# Altium footprint library Indruino.PcbLib: 383 footprints (part 2 of 24)
Each footprint in its own frame and in the unit in brackets; x right, y up, seen from the top. Pads: shape width x height; smd on the part's side, far side on the other; paste and mask are expansions set on the pad; w line width, h text height; cw(c..) or ccw(c..) is an arc to the next point about the centre after c.
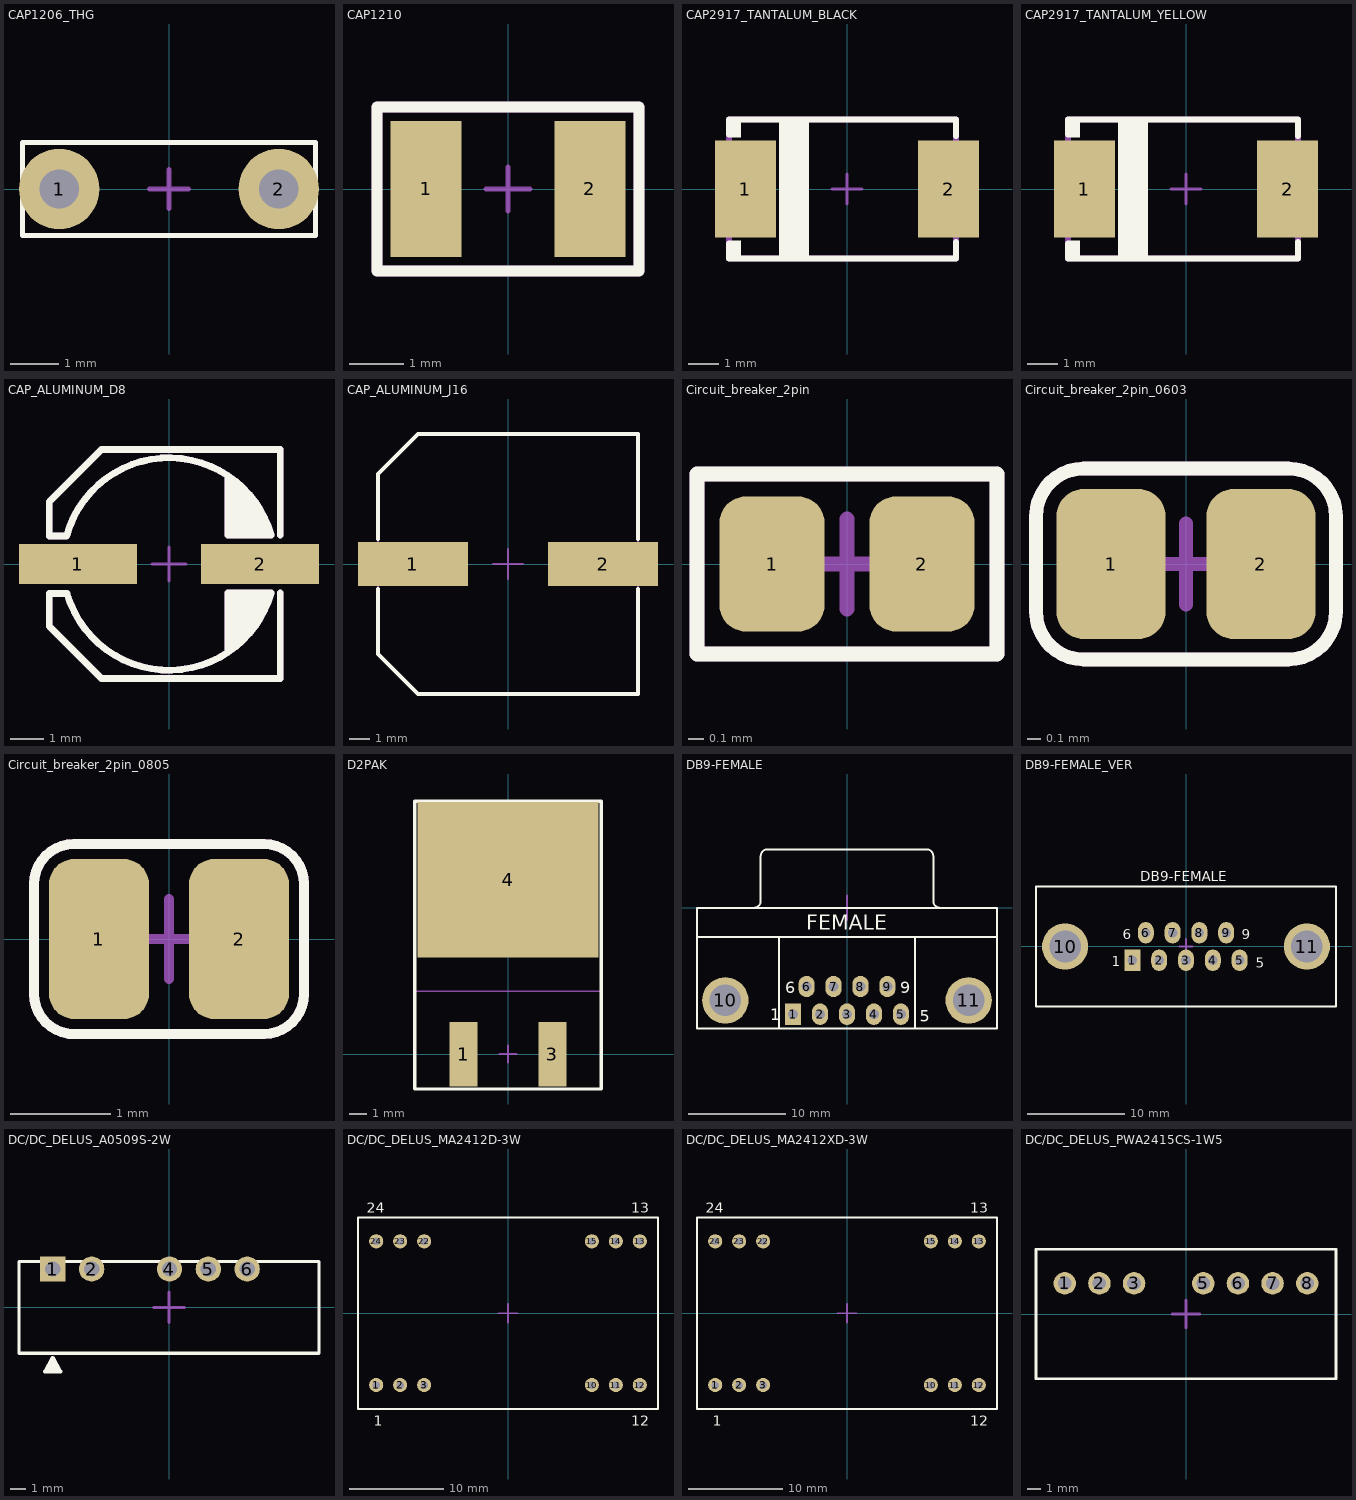
[diagram p1: the footprints below, top view; thin cyan lines are the x and y axes]

## CAP1206_THG [mm]
pads (2):
  round 1.65 hole 0.8: 1(-2.25,0) 2(2.25,0)
Top Overlay:
  lines w0.1: -3,-0.95 -3,0.95 3,0.95 3,-0.95 -3,-0.95
Mechanical 13:
  lines w0.1: -3,-0.95 -3,0.95 3,0.95 3,-0.95 -3,-0.95
Mechanical 15:
  lines w0.1: -0.4,0 0.4,0 ; 0,-0.4 0,0.4
3D body "User Library-Disc_CAP d6x3_5_5mm.step": height 8.1, standoff -2.02, extent -3,-1.05 3,1.05

## CAP1210 [mm]
pads (2):
  rect 1.3x2.5 smd: 1(-1.5,0) 2(1.5,0)
Top Overlay:
  lines w0.2: -2.4,-1.5 2.4,-1.5 2.4,1.5 -2.4,1.5 -2.4,-1.5
Mechanical 13:
  lines w0.2: -2.4,-1.5 2.4,-1.5 2.4,1.5 -2.4,1.5 -2.4,-1.5
  text "'.Designator'" at -1.95,-0.333 h0.8
Mechanical 15:
  lines w0.1: -0.4,0 0.4,0 ; 0,-0.4 0,0.4
3D body "SW3dPS-CAPC3225.STEP": height 2.5, standoff 0, extent -1.6,-1.25 1.6,1.25

## CAP2917_TANTALUM_BLACK [mm]
pads (2):
  rect 2x3.2 smd: 1(-3.35,0) 2(3.35,0)
Top Overlay:
  rectangle: -3.9,1.7 -3.5,2.4
  rectangle: -3.9,-2.4 -3.5,-1.7
  rectangle: -2.25,-2.305 -1.25,2.31
  lines w0.2: -3.9,-1.8 -3.9,-2.3 3.6,-2.3 3.6,-1.75 ; -3.9,1.8 -3.9,2.3 3.6,2.3 3.6,1.75
Mechanical 13:
  lines w0.2: -3.9,-2.3 -3.9,2.3 3.6,2.3 3.6,-2.3 -3.9,-2.3
  text "'.Designator'" at -3.2,-0.5 h1.2
Mechanical 15:
  lines w0.1: -0.5,0 0.5,0 ; 0,-0.5 0,0.5
3D body "User Library-Case Code KEMET V.STEP": height 2.1, standoff 0.1, extent -3.81,-2.3 3.79,2.3

## CAP2917_TANTALUM_YELLOW [mm]
pads (2):
  rect 2x3.2 smd: 1(-3.35,0) 2(3.35,0)
Top Overlay:
  rectangle: -2.25,-2.305 -1.25,2.31
  rectangle: -3.9,-2.4 -3.5,-1.7
  rectangle: -3.9,1.7 -3.5,2.4
  lines w0.2: -3.9,-1.8 -3.9,-2.3 3.7,-2.3 3.7,-1.75 ; -3.9,1.8 -3.9,2.3 3.7,2.3 3.7,1.75
Mechanical 13:
  lines w0.2: -3.9,-2.3 -3.9,2.3 3.7,2.3 3.7,-2.3 -3.9,-2.3
  text "'.Designator'" at -3.2,-0.5 h1.2
Mechanical 15:
  lines w0.1: -0.5,0 0.5,0 ; 0,-0.5 0,0.5
3D body "User Library-CAP_TANT_7343-31.STEP": height 3.1, standoff 0, extent -3.8,-2.3 3.8,2.3

## CAP_ALUMINUM_D8 [mm] "SMD Tantalum Capacitor; Size D8, Body 6.3 x 7.7 mm (LxW typ)"
height 7.8
pads (2):
  rect 3.5x1.2 smd: 1(-2.7,0) 2(2.7,0)
Top Overlay:
  region: 3.033,0.851 2.957,1.12 2.714,1.624 2.385,2.076 1.982,2.464 1.75,2.619 1.75,2.62 1.75,0.85
  region: 1.749,-2.62 1.982,-2.464 2.385,-2.076 2.714,-1.624 2.957,-1.12 3.033,-0.851 3.03,-0.85 1.75,-0.85
  lines w0.2: 1.749,-2.62 ccw(c0,0) 3.033,-0.851 ; 3.03,-0.85 1.75,-0.85 1.75,-2.62 cw(c0,0) -3.025,-0.878 -3.55,-0.878 -3.55,-1.85 -2,-3.4 3.3,-3.4 3.3,-0.85 ; 3.03,0.85 1.75,0.85 1.75,2.62 ; 3.033,0.851 ccw(c0,0) 1.75,2.619 ; 3.3,0.85 3.3,3.4 -2,3.4 -3.55,1.85 -3.55,0.833 -3.038,0.833 cw(c0,0) 1.75,2.619
Mechanical 13:
  region: 3.033,0.851 2.957,1.12 2.714,1.624 2.385,2.076 1.982,2.464 1.75,2.619 1.75,2.62 1.75,0.85
  region: 1.749,-2.62 1.982,-2.464 2.385,-2.076 2.714,-1.624 2.957,-1.12 3.033,-0.851 3.03,-0.85 1.75,-0.85
  lines w0.2: 1.749,-2.62 ccw(c0,0) 3.033,-0.851 ; 3.03,-0.85 1.75,-0.85 1.75,-2.62 cw(c0,0) -3.025,-0.878 -3.55,-0.878 -3.55,-1.85 -2,-3.4 3.3,-3.4 3.3,-0.85 ; 3.03,0.85 1.75,0.85 1.75,2.62 ; 3.033,0.851 ccw(c0,0) 1.75,2.619 ; 3.3,0.85 3.3,3.4 -2,3.4 -3.55,1.85 -3.55,0.833 -3.038,0.833 cw(c0,0) 1.75,2.619
  text "'.Designator'" at -2.3,-0.4 h1.2
Mechanical 15:
  lines w0.1: -0.5,0 0.5,0 ; 0,-0.5 0,0.5
3D body "SMD cap code size D8.STEP": height 8.5, standoff -0.01, extent -3.471,-3.3 3.529,3.3

## CAP_ALUMINUM_J16 [mm] "SMD Aluminum Capacitor; Size J16, Dia 12.5mm, Body 13x 13.5 mm (LxW typ)"
height 13.5
pads (2):
  rect 5.5x2.2 smd: 1(-4.75,0) 2(4.75,0)
Top Overlay:
  lines w0.2: -6.5,-1.25 -6.5,-4.5 -4.5,-6.5 6.5,-6.5 6.5,-1.25 ; -6.5,1.25 -6.5,4.5 -4.5,6.5 6.5,6.5 6.5,1.25
Mechanical 13:
  lines w0.1: -6.5,-4.5 -6.5,4.5 -4.5,6.5 6.5,6.5 6.5,-6.5 -4.5,-6.5 -6.5,-4.5
Mechanical 15:
  lines w0.1: -0.75,0 0.75,0 ; 0,-0.75 0,0.75
3D body "CHEMI-KE0.stp": height 13.54, standoff 0, extent -6.845,-6.502 6.845,6.502

## Circuit_breaker_2pin [mm]
height 0.85
pads (2):
  rrect50% 0.7x0.9 smd: 1(-0.5,0) 2(0.5,0)
Top Overlay:
  lines w0.1: -1,-0.6 -1,0.6 1,0.6 1,-0.6 -1,-0.6
Mechanical 13:
  lines w0.1: -1,-0.6 -1,0.6 1,0.6 1,-0.6 -1,-0.6
Mechanical 15:
  lines w0.1: -0.3,0 0.3,0 ; 0,-0.3 0,0.3

## Circuit_breaker_2pin_0603 [mm]
height 0.85
pads (2):
  rrect50% 0.8x1.1 smd: 1(-0.55,0) 2(0.55,0)
Top Overlay:
  lines w0.1: -1.1,-0.35 ccw(c-0.75,-0.35) -0.75,-0.7 0.75,-0.7 ccw(c0.75,-0.35) 1.1,-0.35 1.1,0.35 ccw(c0.75,0.35) 0.75,0.7 -0.75,0.7 ccw(c-0.75,0.35) -1.1,0.35 -1.1,-0.35
Mechanical 13:
  lines w0.1: -1.1,-0.35 ccw(c-0.75,-0.35) -0.75,-0.7 0.75,-0.7 ccw(c0.75,-0.35) 1.1,-0.35 1.1,0.35 ccw(c0.75,0.35) 0.75,0.7 -0.75,0.7 ccw(c-0.75,0.35) -1.1,0.35 -1.1,-0.35
Mechanical 15:
  lines w0.1: -0.3,0 0.3,0 ; 0,-0.3 0,0.3

## Circuit_breaker_2pin_0805 [mm]
height 0.85
pads (2):
  rrect50% 1x1.6 smd: 1(-0.7,0) 2(0.7,0)
Top Overlay:
  lines w0.1: -1,-0.95 0.95,-0.95 ccw(c0.95,-0.55) 1.35,-0.55 1.35,0.55 ccw(c0.95,0.55) 0.95,0.95 -0.95,0.95 ccw(c-0.95,0.55) -1.35,0.55 -1.35,-0.55 ccw(c-0.95,-0.55) -0.95,-0.95
Mechanical 13:
  lines w0.1: -1.35,-0.55 ccw(c-0.95,-0.55) -0.95,-0.95 0.95,-0.95 ccw(c0.95,-0.55) 1.35,-0.55 1.35,0.55 ccw(c0.95,0.55) 0.95,0.95 -0.95,0.95 ccw(c-0.95,0.55) -1.35,0.55 -1.35,-0.55
Mechanical 15:
  lines w0.1: -0.4,0 0.4,0 ; 0,-0.4 0,0.4

## D2PAK [mm] "D2-PAK, 4-Leads, Body 9.2x10mm, Pitch 2.54mm, Lead Span 14.2mm, IPC Low Density"
height 4.57
pads (3):
  rect 1.6x3.7 smd: 1(-2.54,0) 3(2.54,0)
  rect 10.4x8.9 smd: 4(0,10)
Top Overlay:
  lines w0.2: -5.35,-2 -5.35,14.5 5.35,14.5 5.35,-2 -5.35,-2
Mechanical 13:
  lines w0.1: -5.35,3.6 5.35,3.6 5.35,14.5 -5.35,14.5 -5.35,3.6
Mechanical 15:
  lines w0.1: -0.5,0 0.5,0 ; 0,-0.5 0,0.5
3D body "User Library-DPAK.step": height 4.98, standoff -0.03, extent -5.08,-1.166 5.08,14.098

## DB9-FEMALE [mm]
pads (11):
  rect 1.65x2.2 hole 1: 1(-5.54,-10.92)
  oval 1.65x2.2 hole 1: 2(-2.77,-10.92) 3(0,-10.92) 4(2.77,-10.92) 5(5.54,-10.92) 6(-4.155,-8.08) 7(-1.385,-8.08) 8(1.385,-8.08) 9(4.155,-8.08)
  round 4.76 hole 3.26: 10(-12.495,-9.5) 11(12.495,-9.5)
Top Overlay:
  lines w0.2: -15.4,-3 15.4,-3 ; -9.56,0.005 ccw(c-9.56,0.7) -8.865,0.7 -8.865,5.3 ; -8.86,5.305 cw(c-8.165,5.305) -8.165,6 8.165,6 cw(c8.165,5.305) 8.86,5.305 ; -7,-12.4 -7,-3 ; 7,-12.4 7,-3 ; 8.865,5.3 8.865,0.7 ccw(c9.56,0.7) 9.56,0.005 ; -15.4,-12.4 15.4,-12.4 15.4,0 -15.4,0 -15.4,-12.4
  text "FEMALE" at -4.16,-2.261 h1.52
  text "6" at -6.354,-8.763 h1.2
  text "9" at 5.461,-8.763 h1.2
  text "5" at 7.493,-11.684 h1.2
  text "1" at -7.882,-11.557 h1.2
Mechanical 15:
  lines w0.2: -1.25,0 1.25,0 ; 0,-1.25 0,1.25
3D body "User Library-DB9-Usa.step": height 12.54, standoff -4.33, extent -15.405,-12.5 15.405,5.8

## DB9-FEMALE_VER [mm]
pads (11):
  rect 1.65x2.2 hole 1: 1(-5.54,-1.42)
  oval 1.65x2.2 hole 1: 2(-2.77,-1.42) 3(0,-1.42) 4(2.77,-1.42) 5(5.54,-1.42) 6(-4.155,1.42) 7(-1.385,1.42) 8(1.385,1.42) 9(4.155,1.42)
  round 4.76 hole 3.26: 10(-12.495,0) 11(12.495,0)
Top Overlay:
  lines w0.2: -15.5,-6.2 15.5,-6.2 15.5,6.2 -15.5,6.2 -15.5,-6.2
  text "DB9-FEMALE" at -4.75,6.75 h1
  text "6" at -6.554,0.737 h1
  text "9" at 5.761,0.737 h1
  text "5" at 7.193,-2.184 h1
  text "1" at -7.682,-2.057 h1
Mechanical 15:
  lines w0.2: -0.7,0 0.7,0 ; 0,-0.8 0,0.8
3D body "Threaded Standoffs_length 6mm.step": height 6, standoff -6, extent 9.608,-2.5 15.382,2.5
3D body "Threaded Standoffs_length 6mm.step": height 6, standoff -6, extent -15.382,-2.5 -9.608,2.5
3D body "User Library-con-116-1.step": height 12.9, standoff -4, extent -15.499,-6.2 15.499,6.2

## DC/DC_DELUS_A0509S-2W [mm] "Delus DC/DC Converter"
pads (5):
  rect 1.65x1.65 hole 1: 1(-7.59,2.5)
  round 1.65 hole 1: 2(-5.05,2.5) 4(0.03,2.5) 5(2.57,2.5) 6(5.11,2.5)
Top Overlay:
  region: -8.1,-4.2 -7.6,-3.3 -7.1,-4.2
  lines w0.2: -9.8,-3 9.8,-3 9.8,3 -9.8,3 -9.8,-3
  lines w0.254: -8.1,-4.2 -7.1,-4.2 -7.6,-3.3 -8.1,-4.2
Mechanical 15:
  lines w0.2: -1,0 1,0 ; 0,-1 0,1
3D body: height 10.2, standoff 0, extent -9.8,-3 9.8,3

## DC/DC_DELUS_MA2412D-3W [mm] "Delus DC/DC Converter"
pads (12):
  round 1.5 hole 0.8: 1(-13.97,-7.62) 2(-11.43,-7.62) 3(-8.89,-7.62) 10(8.89,-7.62) 11(11.43,-7.62) 12(13.97,-7.62) 13(13.97,7.62) 14(11.43,7.62) 15(8.89,7.62) 22(-8.89,7.62) 23(-11.43,7.62) 24(-13.97,7.62)
Top Overlay:
  lines w0.2: -15.9,-10.15 -15.9,10.15 15.9,10.15 15.9,-10.15 -15.9,-10.15
  text "24" at -14.986,10.668 h1.1
  text "13" at 13.081,10.668 h1.1
  text "12" at 13.081,-11.938 h1.1
  text "1" at -14.224,-11.938 h1.1
Mechanical 15:
  lines w0.2: -1,0 1,0 ; 0,-1 0,1
3D body: height 10.2, standoff 0, extent -15.9,-10.15 15.9,10.15

## DC/DC_DELUS_MA2412XD-3W [mm] "Delus DC/DC Converter"
pads (12):
  round 1.5 hole 0.8: 1(-13.97,-7.62) 2(-11.43,-7.62) 3(-8.89,-7.62) 10(8.89,-7.62) 11(11.43,-7.62) 12(13.97,-7.62) 13(13.97,7.62) 14(11.43,7.62) 15(8.89,7.62) 22(-8.89,7.62) 23(-11.43,7.62) 24(-13.97,7.62)
Top Overlay:
  lines w0.2: -15.9,-10.15 -15.9,10.15 15.9,10.15 15.9,-10.15 -15.9,-10.15
  text "24" at -14.986,10.668 h1.1
  text "13" at 13.081,10.668 h1.1
  text "12" at 13.081,-11.938 h1.1
  text "1" at -14.224,-11.938 h1.1
Mechanical 15:
  lines w0.2: -1,0 1,0 ; 0,-1 0,1
3D body: height 10.2, standoff 0, extent -15.9,-10.15 15.9,10.15

## DC/DC_DELUS_PWA2415CS-1W5 [mm] "Delus DC/DC Converter"
pads (7):
  round 1.65 hole 1: 1(-8.89,2.25) 2(-6.35,2.25) 3(-3.81,2.25) 5(1.27,2.25) 6(3.81,2.25) 7(6.35,2.25) 8(8.89,2.25)
Top Overlay:
  lines w0.2: -11,-4.75 11,-4.75 11,4.75 -11,4.75 -11,-4.75
Mechanical 15:
  lines w0.2: -1,0 1,0 ; 0,-1 0,1
3D body: height 12, standoff 0, extent -11,-4.75 11,4.75